# Altium footprint library 封装库.PcbLib: 755 footprints (part 33 of 48)
Each footprint in its own frame and in the unit in brackets; x right, y up, seen from the top. Pads: shape width x height; smd on the part's side, far side on the other; paste and mask are expansions set on the pad; w line width, h text height; cw(c..) or ccw(c..) is an arc to the next point about the centre after c.
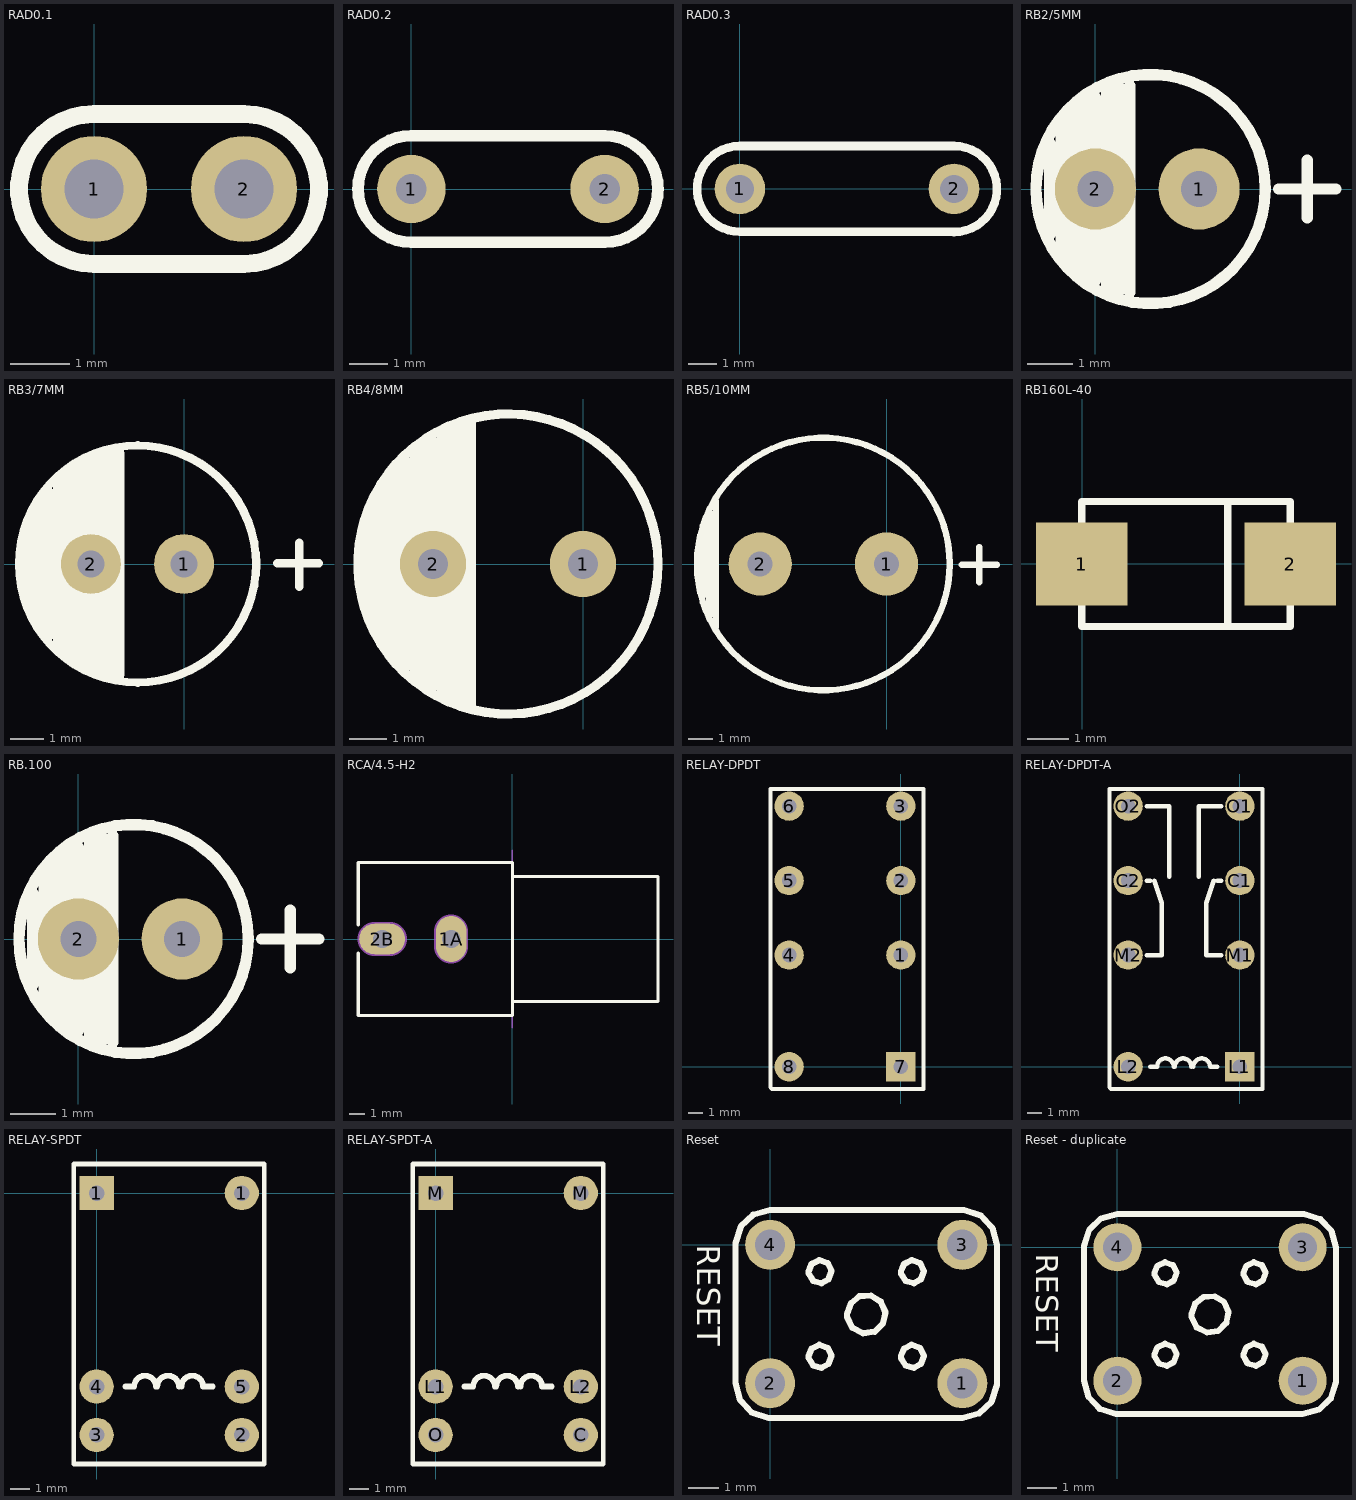
[diagram p32: the footprints below, top view; thin cyan lines are the x and y axes]

## RAD0.1 [mm]
pads (2):
  round 1.8 hole 1: 1(0,0) 2(2.54,0)
Top Overlay:
  lines w0.305: 0,-1.27 cw(c0,0) 0,1.27 2.54,1.27 cw(c2.54,0) 2.54,-1.27 0,-1.27

## RAD0.2 [mm]
pads (2):
  round 1.8 hole 0.8: 1(0,0) 2(5.08,0)
Top Overlay:
  lines w0.305: 0,-1.403 cw(c0,0) 0,1.403 5.08,1.403 cw(c5.08,0) 5.08,-1.403 0,-1.403

## RAD0.3 [mm]
pads (2):
  round 1.8 hole 1: 1(0,0) 2(7.62,0)
Top Overlay:
  lines w0.305: 7.62,-1.536 ccw(c7.62,-0.006) 7.62,1.524 0,1.524 ccw(c0,0) 0,-1.524 7.62,-1.524

## RB2/5MM [mm]
pads (2):
  round 1.8 hole 0.8: 1(2.3,0) 2(0,0)
Top Overlay:
  circle w0.254: c1.224,0 r2.54
  lines w0.254: -1.016,-1.016 -1.016,1.016 ; -0.762,-1.524 -0.762,1.524 ; -0.508,-1.778 -0.508,1.778 ; -0.254,-2.032 -0.254,2.032 ; 0,-2.032 0,2.032 ; 0.254,-2.286 0.254,2.286 ; 0.508,-2.286 0.508,2.286 ; 0.762,-2.286 0.762,2.286 ; 4.064,0 5.334,0 ; 4.699,-0.635 4.699,0.635

## RB3/7MM [mm]
pads (2):
  round 1.8 hole 0.8: 1(0,0) 2(-2.794,0)
Top Overlay:
  circle w0.254: c-1.397,0 r3.556
  lines w0.254: -3.81,-2.54 -3.81,2.54 ; -3.556,-2.794 -3.556,2.794 ; -3.048,-3.048 -3.048,3.048 ; -2.286,-3.302 -2.286,3.302 ; 2.794,0.016 4.048,0.016 ; 3.454,-0.686 3.454,0.635
  lines w0.3: -4.826,-0.762 -4.826,0.762 ; -4.572,-1.524 -4.572,1.524 ; -4.318,-1.778 -4.318,1.778 ; -2.54,-3.302 -2.54,3.302
  lines w0.5: -4.064,-2.032 -4.064,2.032 ; -3.302,-2.794 -3.302,2.794 ; -2.794,-3.048 -2.794,3.048 ; -2.032,-3.302 -2.032,3.302

## RB4/8MM [mm]
pads (2):
  round 1.8 hole 0.8: 1(0,0) 2(-4.064,0)
Top Overlay:
  circle w0.254: c-2.032,0 r4.064
  lines w0.254: -5.08,-2.54 -5.08,2.54 ; -4.572,-3.048 -4.572,3.048
  lines w0.3: -5.842,-1.27 -5.842,1.27 ; -5.588,-1.778 -5.588,1.778 ; -5.334,-2.286 -5.334,2.286 ; -4.826,-2.794 -4.826,2.794 ; -4.318,-3.302 -4.318,3.302 ; -4.064,-3.302 -4.064,3.302 ; -3.81,-3.556 -3.81,3.556 ; -3.556,-3.556 -3.556,3.556 ; -3.302,-3.81 -3.302,3.81 ; -3.048,-3.81 -3.048,3.81

## RB5/10MM [mm]
pads (2):
  round 2.54 hole 1: 1(0,0) 2(-5.08,0)
Top Overlay:
  circle w0.254: c-2.54,0 r5.08
  lines w0.254: -7.366,-1.27 -7.366,1.524 ; -6.858,-2.54 -6.858,2.54 ; 3.023,-0.025 4.442,-0.025 ; 3.734,-0.737 3.734,0.686
  lines w0.305: -7.112,-2.032 -7.112,2.032

## RB160L-40 [mm]
pads (2):
  rect 2.2x2 smd: 1(-0.014,-0.01) 2(4.986,-0.01)
Top Overlay:
  lines w0.178: -0.014,-1.01 -0.014,-1.51 4.986,-1.51 4.986,-1.01 ; -0.014,0.99 -0.014,1.49 4.986,1.49 4.986,0.99 ; 3.486,-1.51 3.486,1.49

## RB.100 [mm]
pads (2):
  round 1.8 hole 0.8: 1(2.3,0) 2(0,0)
Top Overlay:
  circle w0.254: c1.224,0 r2.54
  lines w0.254: -1.016,-1.016 -1.016,1.016 ; -0.762,-1.524 -0.762,1.524 ; -0.508,-1.778 -0.508,1.778 ; -0.254,-2.032 -0.254,2.032 ; 0,-2.032 0,2.032 ; 0.254,-2.286 0.254,2.286 ; 0.508,-2.286 0.508,2.286 ; 0.762,-2.286 0.762,2.286 ; 4.064,0 5.334,0 ; 4.699,-0.635 4.699,0.635

## RCA/4.5-H2 [mm] "Two Conductor Jack (RCA), Right Angle, Thru-Hole, Body 10 x 10 x 13 mm (WxTxH)"
height 13
pads (2):
  oval 2x3 hole 1.2: 1A(-4,0)
  oval 3x2 hole 1.2: 2B(-8.496,0)
Top Overlay:
  lines w0.2: -10.075,5 -0.018,5 ; -10.057,-0.92 -10.057,-5 0,-5 0,5 ; -10.057,0.92 -10.057,5 ; 0,-4.065 9.5,-4.065 9.5,4.065 0,4.065
Mechanical 1:
  lines w0.1: 0,-5.8 0,5.8
  lines w1.2: -8.996,0 -7.996,0 ; -4,-0.5 -4,0.5
  text "PCB Edge" at -0.333,-4.618 h0.25
  text "Alert PCB fab to slot details" at -10.057,7.842 h0.3
  text "Slot 1.2x2.2mm, PTH" at -10.057,7.342 h0.3
  text "Assign keep-out area to slot" at -10.057,8.342 h0.3
  text "Mech 1 - Slot cut-out" at -10.057,6.842 h0.3
  text "Mech 2 - Clearance, move to internal plane if present" at -10.057,6.342 h0.3
Mechanical 2:
  lines w2.216: -8.996,0 -7.996,0 ; -4,-0.5 -4,0.5

## RELAY-DPDT [mm]
pads (8):
  round 2 hole 1: 1(0,7.62) 2(0,12.7) 3(0,17.78) 4(-7.62,7.62) 5(-7.62,12.7) 6(-7.62,17.78) 8(-7.62,0)
  rect 2x2 hole 1: 7(0,0)
Top Overlay:
  lines w0.3: -8.894,-1.414 -8.894,18.948 1.52,18.948 1.55,18.918 1.55,18.41 1.55,-1.52 -8.45,-1.52 -8.788,-1.52

## RELAY-DPDT-A [mm]
pads (8):
  round 2 hole 1: C1(0,12.7) C2(-7.62,12.7) L2(-7.62,0) M1(0,7.62) M2(-7.62,7.62) O1(0,17.78) O2(-7.62,17.78)
  rect 2x2 hole 1: L1(0,0)
Top Overlay:
  lines w0.3: -8.894,-1.414 -8.894,18.948 1.52,18.948 1.55,18.918 1.55,18.41 1.55,-1.52 -8.45,-1.52 -8.788,-1.52
  lines w0.305: -6.35,7.62 -5.334,7.62 -5.334,11.176 -5.842,12.7 ; -6.35,12.7 -6.096,12.7 ; -6.35,17.78 -4.826,17.78 -4.826,12.954 ; -6.096,0 -5.648,0 cw(c-5.08,0) -4.512,0 ; -4.438,0 cw(c-3.87,0) -3.302,0 ; -3.168,0 cw(c-2.6,0) -2.032,0 -1.524,0 ; -2.794,12.954 -2.794,17.78 -1.27,17.78 ; -1.778,12.7 -2.286,11.176 -2.286,7.62 -1.27,7.62 ; -1.524,12.7 -1.27,12.7

## RELAY-SPDT [mm]
pads (6):
  rect 1.8x1.8 hole 0.813: 1(0,0)
  round 1.8 hole 0.813: 1(7.62,0) 2(7.62,-12.7) 3(0,-12.7) 4(0,-10.16) 5(7.62,-10.16)
Top Overlay:
  lines w0.254: -1.2,-14.224 8.8,-14.224 8.8,1.524 -1.2,1.524 -1.2,-14.224
  lines w0.305: 1.524,-10.16 1.972,-10.16 cw(c2.54,-10.16) 3.108,-10.16 ; 3.182,-10.16 cw(c3.75,-10.16) 4.318,-10.16 ; 4.452,-10.16 cw(c5.02,-10.16) 5.588,-10.16 6.096,-10.16

## RELAY-SPDT-A [mm]
pads (6):
  round 1.8 hole 0.813: C(7.62,-12.7) L1(0,-10.16) L2(7.62,-10.16) M(7.62,0) O(0,-12.7)
  rect 1.8x1.8 hole 0.813: M(0,0)
Top Overlay:
  lines w0.254: -1.2,-14.224 -1.2,1.524 8.8,1.524 8.8,-14.224 -1.2,-14.224
  lines w0.305: 1.524,-10.16 1.972,-10.16 cw(c2.54,-10.16) 3.108,-10.16 ; 3.182,-10.16 cw(c3.75,-10.16) 4.318,-10.16 ; 4.452,-10.16 cw(c5.02,-10.16) 5.588,-10.16 6.096,-10.16

## Reset [mil]
pads (4):
  round 65 hole 39.37: 1(250,-180) 2(0,-180) 3(250,0) 4(0,0)
Top Overlay:
  lines w8: -45,-180 -39,-202 -24,-218 -2,-225 0,-225 250,-225 272,-219 288,-204 295,-182 295,-180 295,0 289,22 274,38 252,45 250,45 0,45 -22,39 -38,24 -45,2 -45,0 -45,-180 ; 50,-147 56,-157 67,-160 76,-155 80,-144 75,-134 64,-130 54,-135 50,-145 50,-147 ; 50,-37 56,-47 67,-50 76,-45 80,-34 75,-24 64,-20 54,-25 50,-35 50,-37 ; 100,-94 107,-108 121,-115 136,-113 147,-102 150,-88 144,-74 131,-66 116,-67 105,-76 100,-90 100,-94 ; 170,-147 176,-157 187,-160 196,-155 200,-144 195,-134 184,-130 174,-135 170,-145 170,-147 ; 170,-37 176,-47 187,-50 196,-45 200,-34 195,-24 184,-20 174,-25 170,-35 170,-37
  text "RESET" at -95,0 h30

## Reset - duplicate [mil]
height 509.06
pads (4):
  round 65 hole 39.37: 1(250,-180) 2(0,-180) 3(250,0) 4(0,0)
Top Overlay:
  lines w8: -45,-180 -39,-202 -24,-218 -2,-225 0,-225 250,-225 272,-219 288,-204 295,-182 295,-180 295,0 289,22 274,38 252,45 250,45 0,45 -22,39 -38,24 -45,2 -45,0 -45,-180 ; 50,-147 56,-157 67,-160 76,-155 80,-144 75,-134 64,-130 54,-135 50,-145 50,-147 ; 50,-37 56,-47 67,-50 76,-45 80,-34 75,-24 64,-20 54,-25 50,-35 50,-37 ; 100,-94 107,-108 121,-115 136,-113 147,-102 150,-88 144,-74 131,-66 116,-67 105,-76 100,-90 100,-94 ; 170,-147 176,-157 187,-160 196,-155 200,-144 195,-134 184,-130 174,-135 170,-145 170,-147 ; 170,-37 176,-47 187,-50 196,-45 200,-34 195,-24 184,-20 174,-25 170,-35 170,-37
  text "RESET" at -109.84,-8.66 h30